# Altium footprint library PcbLib1.PcbLib: 157 footprints (part 3 of 10)
Each footprint in its own frame and in the unit in brackets; x right, y up, seen from the top. Pads: shape width x height; smd on the part's side, far side on the other; paste and mask are expansions set on the pad; w line width, h text height; cw(c..) or ccw(c..) is an arc to the next point about the centre after c.
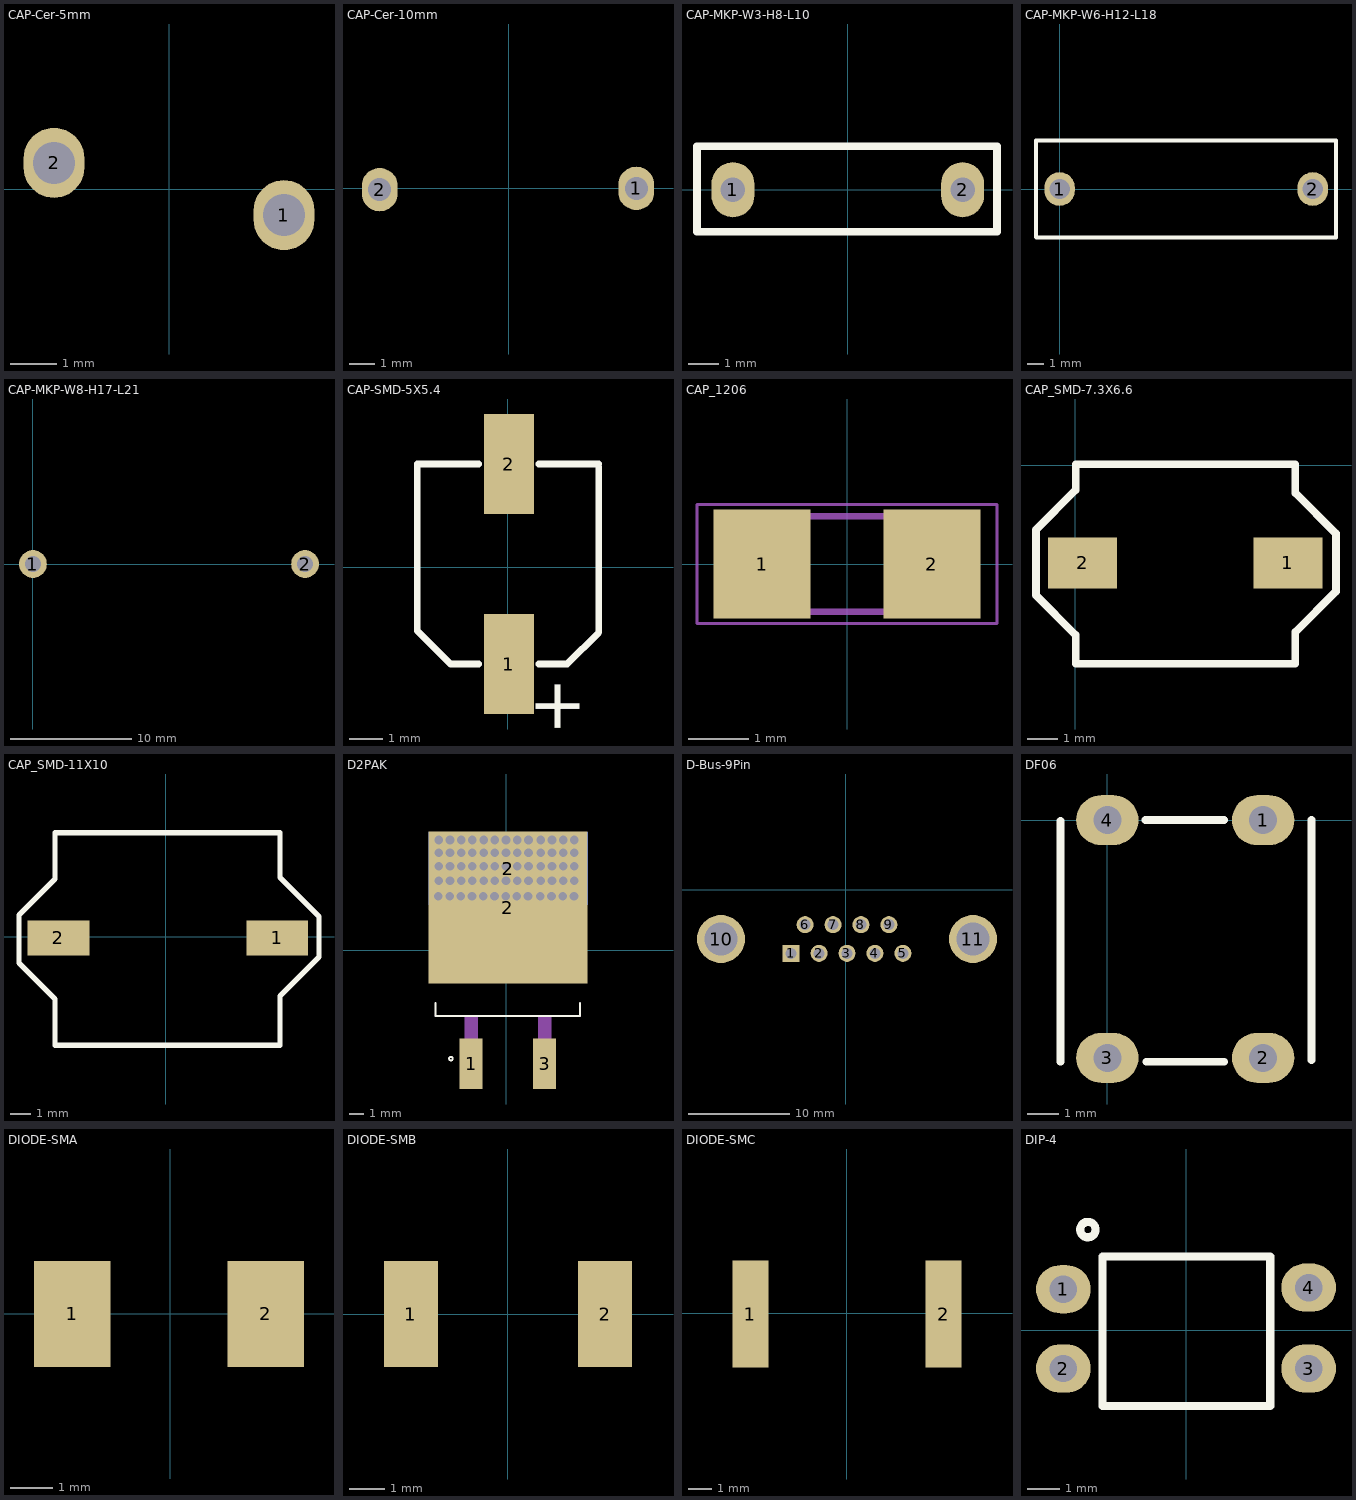
[diagram p2: the footprints below, top view; thin cyan lines are the x and y axes]

## CAP-Cer-5mm [mm]
pads (2):
  oval 1.3x1.5 hole 0.9: 1(2.464,-0.559) 2(-2.464,0.559)
3D body "User Library-Cer-Cap2_5 (5x1_5).STEP": height 5, standoff -3, extent -2.739,-1.133 2.739,1.134

## CAP-Cer-10mm [mm]
pads (2):
  oval 1.4x1.7 hole 0.9: 1(4.978,0) 2(-5.055,-0.051)
3D body "User Library-CAPRR1000W60L1300T400H900_WIMA_3C.STEP": height 8.75, standoff -2.75, extent -6.5,-2 6.5,2

## CAP-MKP-W3-H8-L10 [mm]
pads (2):
  oval 1.4x1.8 hole 0.8: 1(-3.75,0) 2(3.75,0)
Top Overlay:
  lines w0.254: -4.925,-1.375 4.875,-1.375 4.875,1.425 -4.925,1.425 -4.925,-1.375
3D body "User Library-Film Capacitor 10x3x8_5mm.STEP": height 8, standoff -2.5, extent -5,-1.5 5,1.5

## CAP-MKP-W6-H12-L18 [mm]
pads (2):
  oval 1.8x2 hole 1.2: 1(0,0) 2(15,0)
Top Overlay:
  lines w0.254: -1.4,-2.85 -1.375,-2.875 ; -1.4,-2.85 -1.4,2.875 16.375,2.875 16.375,-2.875 -1.375,-2.875 ; -1.4,-2.85 -1.375,-2.875
3D body "User Library-X2.STEP": height 12, standoff -3, extent -1.5,-3 16.5,3

## CAP-MKP-W8-H17-L21 [mm]
pads (2):
  round 2.3 hole 1.3: 1(0,0) 2(22.5,0)
3D body "User Library-X2.STEP": height 16.5, standoff -3, extent -2,-4.25 24.5,4.25

## CAP-SMD-5X5.4 [mm]
pads (2):
  rect 1.5x3 smd: 1(0.025,-2.9) 2(0.025,3.1)
Top Overlay:
  lines w0.2: -0.875,-2.9 -1.725,-2.9 -2.725,-1.9 -2.725,3.1 -0.875,3.1 ; 0.925,-2.9 1.775,-2.9 2.725,-1.95 2.725,3 ; 0.925,3.1 2.725,3.1
  text "+" at 0.825,-3.3 h1.52
3D body "User Library-5x5_4.STEP": height 5.7, standoff 0, extent -2.625,-2.95 2.675,3.35

## CAP_1206 [mm]
height 1.2
pads (2):
  rect 1.6x1.8 smd paste-25.4 mask-25.4: 1(-1.4,0) 2(1.4,0)
Top Paste:
  region: 0.6,-0.9 2.2,-0.9 2.2,0.9 0.6,0.9
  region: -2.2,-0.9 -0.6,-0.9 -0.6,0.9 -2.2,0.9
Top Solder:
  region: 0.5,-1 2.3,-1 2.3,1 0.5,1
  region: -2.3,-1 -0.5,-1 -0.5,1 -2.3,1
Mechanical 1:
  lines w0.051: -2.473,-0.983 -2.473,0.983 2.473,0.983 2.473,-0.983 -2.473,-0.983
  lines w0.102: -0.965,-0.787 0.965,-0.787 ; -0.965,0.787 0.965,0.787
3D body "SW3dPS-1206 SMD Capacitor.STEP": height 1, standoff 0, extent -1.6,-0.775 1.6,0.825

## CAP_SMD-7.3X6.6 [mm]
pads (2):
  rect 2.3x1.7 smd: 1(7.075,-3.25) 2(0.25,-3.25)
Top Overlay:
  lines w0.254: -1.3,-4.325 0.025,-5.65 0.025,-6.6 7.325,-6.6 7.325,-5.55 8.675,-4.2 8.675,-2.275 7.325,-0.925 7.325,0.025 0.025,0.025 0.025,-0.825 -1.3,-2.15 -1.3,-4.325
3D body "User Library-SMD Polymer Aluminum Electrolytic Capacitors C6 39uF 16V.STEP": height 5.9, standoff -0.05, extent 0.025,-6.6 7.325,0

## CAP_SMD-11X10 [mm]
pads (2):
  rect 3x1.7 smd: 1(5.45,-0.05) 2(-5.225,-0.05)
Top Overlay:
  lines w0.254: -7.15,-1.275 -7.15,1.075 -5.4,2.825 -5.4,5.075 5.575,5.075 5.575,2.9 7.475,1 7.475,-0.975 5.575,-2.875 5.575,-5.275 -5.4,-5.275 -5.4,-5.2 -5.4,-3.025 -7.15,-1.275
3D body "User Library-SMD Polymer Aluminum Electrolytic Capacitors F12 330uF 16V.STEP": height 11.1, standoff -0.05, extent -5.4,-5.225 5.6,5.075

## D2PAK [mm]
pads (69):
  rect 1.6x3.5 smd: 1(-2.413,-7.843) 3(2.667,-7.843)
  round 0 hole 0.6: 2(-4.675,3.725) 2(-4.65,4.8) 2(-4.65,5.8) 2(-4.65,6.75) 2(-4.65,7.625) 2(-3.9,3.725) 2(-3.875,4.8) 2(-3.875,5.8) 2(-3.875,6.75) 2(-3.875,7.625) 2(-3.125,3.725) 2(-3.1,4.8) 2(-3.1,5.8) 2(-3.1,6.75) 2(-3.1,7.625) 2(-2.35,3.725) 2(-2.325,4.8) 2(-2.325,5.8) 2(-2.325,6.75) 2(-2.325,7.625) 2(-1.575,3.725) 2(-1.55,4.8) 2(-1.55,5.8) 2(-1.55,6.75) 2(-1.55,7.625) 2(-0.8,3.725) 2(-0.775,4.8) 2(-0.775,5.8) 2(-0.775,6.75) 2(-0.775,7.625) 2(-0.025,3.725) 2(0,4.8) 2(0,5.8) 2(0,6.75) 2(0,7.625) 2(0.75,3.725) 2(0.775,4.8) 2(0.775,5.8) 2(0.775,6.75) 2(0.775,7.625) 2(1.525,3.725) 2(1.55,4.8) 2(1.55,5.8) 2(1.55,6.75) 2(1.55,7.625) 2(2.375,3.725) 2(2.4,4.8) 2(2.4,5.8) 2(2.4,6.75) 2(2.4,7.625) 2(3.15,3.725) 2(3.175,4.8) 2(3.175,5.8) 2(3.175,6.75) 2(3.175,7.625) 2(3.925,3.725) 2(3.95,4.8) 2(3.95,5.8) 2(3.95,6.75) 2(3.95,7.625) 2(4.7,3.725) 2(4.725,4.8) 2(4.725,5.8) 2(4.725,6.75) 2(4.725,7.625)
  rect 11x10.5 smd paste-7: 2(0.125,2.95)
  rect 11x5 smd far side paste-7: 2(0.15,5.65)
Top Overlay:
  circle w0.127: c-3.81,-7.493 r0.127
  lines w0.127: -4.873,-3.658 -4.873,-4.543 5.127,-4.543 5.127,-3.658
Top Paste:
  region: -0.169,6.077 -0.169,4.707 -1.638,4.707 -1.638,6.077
  region: 1.893,6.077 1.893,4.701 0.422,4.701 0.422,6.077
  region: -2.235,6.077 -2.235,4.701 -3.703,4.701 -3.703,6.077
  region: 3.964,6.077 3.964,4.707 2.487,4.707 2.487,6.077
Mechanical 13:
  region: -1.967,-4.543 -1.967,-9.359 -2.863,-9.359 -2.863,-4.543
  region: 3.123,-4.543 3.123,-9.359 2.217,-9.359 2.217,-4.543
  lines w0.127: -4.873,-4.543 5.127,-4.543 ; -4.873,6.257 5.127,6.257
3D body "User Library-DPAK.STEP": height 4.98, standoff -0.03, extent -4.98,-8.591 5.18,6.673

## D-Bus-9Pin [mm]
pads (11):
  rect 1.69x1.69 hole 1.09: 1(-5.413,-6.323)
  round 1.69 hole 1.09: 2(-2.643,-6.323) 3(0.127,-6.323) 4(2.897,-6.323) 5(5.667,-6.323) 6(-4.028,-3.483) 7(-1.258,-3.483) 8(1.512,-3.483) 9(4.282,-3.483)
  round 4.76 hole 3.26: 10(-12.368,-4.903) 11(12.622,-4.903)
3D body "User Library-D-Sub 9P Male TH.STEP": height 1.5, standoff -15.45, extent -15.275,-11.175 15.525,1.375

## DF06 [mm]
pads (4):
  oval 2x1.6 hole 0.9: 1(5,0) 2(5,-7.625) 3(0,-7.625) 4(0,0)
Top Overlay:
  lines w0.254: -1.5,-7.75 -1.5,-0.025 ; 1.225,0 3.75,0 ; 1.25,-7.75 3.75,-7.75 ; 6.55,-7.7 6.55,0
3D body "User Library-Silicon Bridge Rectifiers DF06.STEP": height 3.75, standoff -3.06, extent -1.575,-7.835 6.625,0.085

## DIODE-SMA [mm]
pads (2):
  rect 1.8x2.5 smd: 1(-2.3,0) 2(2.25,0)
3D body "User Library-DIOM5528X26.STEP": height 2.6, standoff 0.03, extent -2.775,-1.4 2.725,1.4

## DIODE-SMB [mm]
pads (2):
  rect 1.524x3 smd: 1(-2.75,0) 2(2.75,0)
3D body "User Library-DIOM5539X24.STEP": height 2.45, standoff 0.03, extent -2.75,-1.95 2.75,1.95

## DIODE-SMC [mm]
pads (2):
  rect 1.524x4.5 smd: 1(-4.065,-0.025) 2(4.065,-0.025)
3D body "User Library-DIOM8261X24.STEP": height 2.4, standoff 0.03, extent -4.065,-3.075 4.065,3.025

## DIP-4 [mm]
pads (4):
  oval 1.7x1.5 hole 0.85: 1(-3.81,1.27) 2(-3.81,-1.194) 3(3.81,-1.194) 4(3.81,1.321)
Top Overlay:
  circle w0.254: c-3.048,3.124 r0.24
  lines w0.254: -2.591,-2.362 2.616,-2.362 2.616,2.286 -2.591,2.286 -2.591,-2.362
3D body "User Library-DIP4-7_62-2_54.STEP": height 4.3, standoff -2.7, extent -3.94,-2.295 3.94,2.295